# Altium footprint library CONNECTOR.PcbLib: 169 footprints (part 11 of 11)
Each footprint in its own frame and in the unit in brackets; x right, y up, seen from the top. Pads: shape width x height; smd on the part's side, far side on the other; paste and mask are expansions set on the pad; w line width, h text height; cw(c..) or ccw(c..) is an arc to the next point about the centre after c.
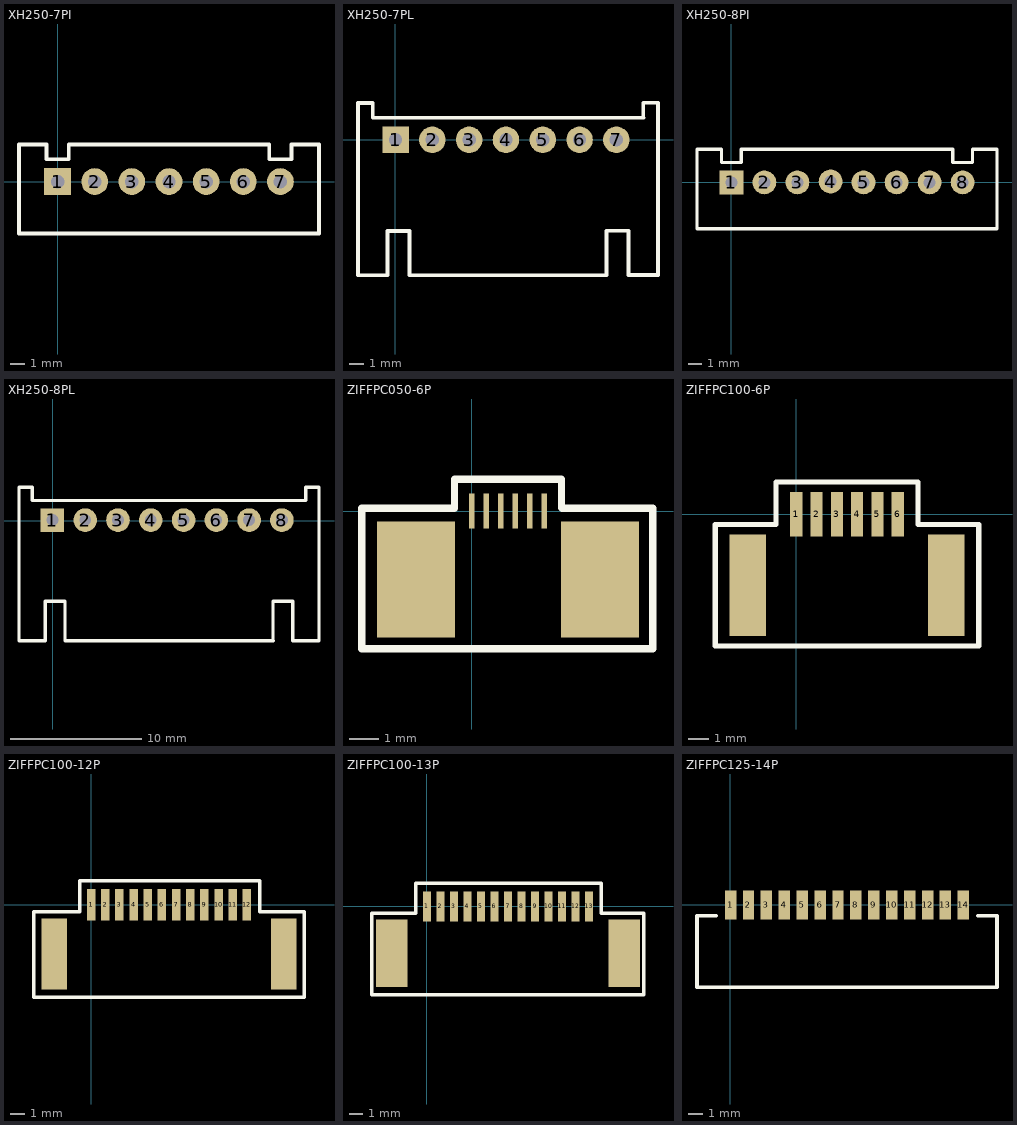
[diagram p10: the footprints below, top view; thin cyan lines are the x and y axes]

## XH250-7PI [mm]
height 7
pads (7):
  rect 1.8x1.8 hole 0.9: 1(0,0)
  round 1.8 hole 0.9: 2(2.5,0) 3(5,0) 4(7.5,0) 5(10,0) 6(12.5,0) 7(15,0)
Top Overlay:
  lines w0.25: -2.6,2.5 -2.6,-3.5 17.6,-3.5 17.6,2.5 ; -2.6,2.5 -0.75,2.5 -0.75,1.5 0.75,1.5 0.75,2.5 14.25,2.5 14.25,1.5 15.75,1.5 15.75,2.5 17.6,2.5
3D body "B7B-XH-A.STEP": height 7, standoff -3.4, extent -2.45,-3.36 17.45,2.39

## XH250-7PL [mm]
pads (7):
  rect 1.8x1.8 hole 0.9: 1(0.024,0.012)
  round 1.8 hole 0.9: 2(2.524,0.012) 3(5.024,0.012) 4(7.524,0.012) 5(10.024,0.012) 6(12.524,0.012) 7(15.024,0.012)
Top Overlay:
  lines w0.25: 14.333,-9.188 0.974,-9.188 0.974,-6.188 -0.526,-6.188 -0.526,-9.188 -2.526,-9.188 -2.526,2.512 -1.526,2.512 -1.526,1.512 16.867,1.512 ; 14.352,-9.177 14.352,-6.177 15.852,-6.177 15.852,-9.177 17.852,-9.177 17.852,2.523 16.852,2.523 16.852,1.523

## XH250-8PI [mm]
pads (8):
  rect 1.8x1.8 hole 0.9: 1(-0.001,0)
  round 1.8 hole 0.9: 2(2.499,0) 3(4.999,0) 4(7.511,0.065) 5(9.999,0) 6(12.499,0) 7(14.999,0) 8(17.499,0)
Top Overlay:
  lines w0.25: -2.601,2.5 -2.601,-3.5 20.083,-3.5 ; -2.601,2.5 -0.751,2.5 -0.751,1.5 0.749,1.5 0.749,2.5 16.728,2.5 ; 16.749,2.5 16.749,1.5 18.249,1.5 18.249,2.5 20.099,2.5 ; 20.099,-3.5 20.099,2.5
3D body "User Library-B8B-XH-A.STEP": height 7, standoff -3.4, extent -2.514,-3.307 19.886,2.443

## XH250-8PL [mm]
pads (8):
  rect 1.8x1.8 hole 0.9: 1(-0.028,0.033)
  round 1.8 hole 0.9: 2(2.472,0.033) 3(4.972,0.033) 4(7.472,0.033) 5(9.972,0.033) 6(12.472,0.033) 7(14.972,0.033) 8(17.472,0.033)
Top Overlay:
  lines w0.25: 11.722,-9.167 0.922,-9.167 0.922,-6.167 -0.578,-6.167 -0.578,-9.167 -2.578,-9.167 -2.578,2.533 -1.578,2.533 -1.578,1.533 19.302,1.533 19.302,2.533 20.302,2.533 20.302,-9.167 18.302,-9.167 18.302,-6.167 16.802,-6.167 16.802,-9.167
  lines w0.254: 11.722,-9.167 16.802,-9.167

## ZIFFPC050-6P [mm]
pads (8):
  rect 0.2x1.2 smd: 1(0,0) 2(0.5,0) 3(1,0) 4(1.5,0) 5(2,0) 6(2.5,0)
  rect 2.7x4 smd: ""(-1.93,-2.36) ""(4.43,-2.36)
Top Overlay:
  lines w0.254: -0.617,0.1 -3.8,0.1 -3.8,-4.757 6.244,-4.757 6.244,0.1 3.118,0.1 ; -0.6,0.1 -0.6,1.1 3.1,1.1 3.1,0.115
3D body "71138.stp": height 1.82, standoff -0.05, extent -2.999,-4.397 5.501,0.503

## ZIFFPC100-6P [mm]
pads (8):
  rect 0.6x2.2 smd: 1(0,0) 2(1,0) 3(2,0) 4(3,0) 5(4,0) 6(5,0)
  rect 1.8x5 smd: ""(-2.4,-3.5) ""(7.4,-3.5)
Top Overlay:
  lines w0.254: -4,-6.5 9,-6.5 9,-0.5 6,-0.5 6,1.587 -1,1.587 -1,-0.5 -4,-0.5 -4,-6.5
3D body "1734798-6.stp": height 3.3, standoff 0.1, extent -3.144,-6.04 8.156,0.759

## ZIFFPC100-12P [mm]
pads (14):
  rect 0.6x2.2 smd: 1(0,0) 2(1,0) 3(2,0) 4(3,0) 5(4,0) 6(5,0) 7(6,0) 8(7,0) 9(8,0) 10(9,0) 11(10,0) 12(11,0)
  rect 1.8x5 smd: ""(-2.6,-3.468) ""(13.6,-3.468)
Top Overlay:
  lines w0.254: -4.063,-0.518 -4.063,-6.532 15.06,-6.532 15.06,-0.5 11.899,-0.5 11.899,1.691 ; -4.063,-0.5 -0.821,-0.5 -0.821,1.691 ; -0.821,1.7 11.899,1.7
3D body "68611214422.stp": height 3, standoff -0.01, extent -3.996,-6.447 15.004,0.653

## ZIFFPC100-13P [mm]
pads (15):
  rect 0.6x2.2 smd: 1(0,0) 2(1,0) 3(2,0) 4(3,0) 5(4,0) 6(5,0) 7(6,0) 8(7,0) 9(8,0) 10(9,0) 11(10,0) 12(11,0) 13(12,0)
  rect 2.3x5 smd: ""(-2.6,-3.468) ""(14.6,-3.468)
Top Overlay:
  lines w0.254: -4.067,-0.518 -4.067,-6.526 16.055,-6.526 16.055,-0.513 12.897,-0.513 12.897,1.7 -0.825,1.7 ; -4.067,-0.5 -0.825,-0.5 -0.825,1.691
3D body "1-1734417-3.stp": height 2.88, standoff -0.16, extent -4.185,-6.243 16.215,0.217

## ZIFFPC125-14P [mm]
pads (14):
  rect 0.8x2 smd: 1(0.015,-0.028) 2(1.26,-0.028) 3(2.51,-0.028) 4(3.76,-0.028) 5(5.01,-0.028) 6(6.26,-0.028) 7(7.51,-0.028) 8(8.76,-0.028) 9(10.01,-0.028) 10(11.26,-0.028) 11(12.51,-0.028) 12(13.76,-0.028) 13(15.01,-0.028) 14(16.26,-0.028)
Top Overlay:
  lines w0.254: -0.985,-0.778 -2.335,-0.778 -2.335,-5.776 -2.333,-5.778 18.61,-5.778 18.61,-0.778 17.26,-0.778